# Altium footprint library motionboard.PcbLib: 89 footprints (part 1 of 6)
Each footprint in its own frame and in the unit in brackets; x right, y up, seen from the top. Pads: shape width x height; smd on the part's side, far side on the other; paste and mask are expansions set on the pad; w line width, h text height; cw(c..) or ccw(c..) is an arc to the next point about the centre after c.
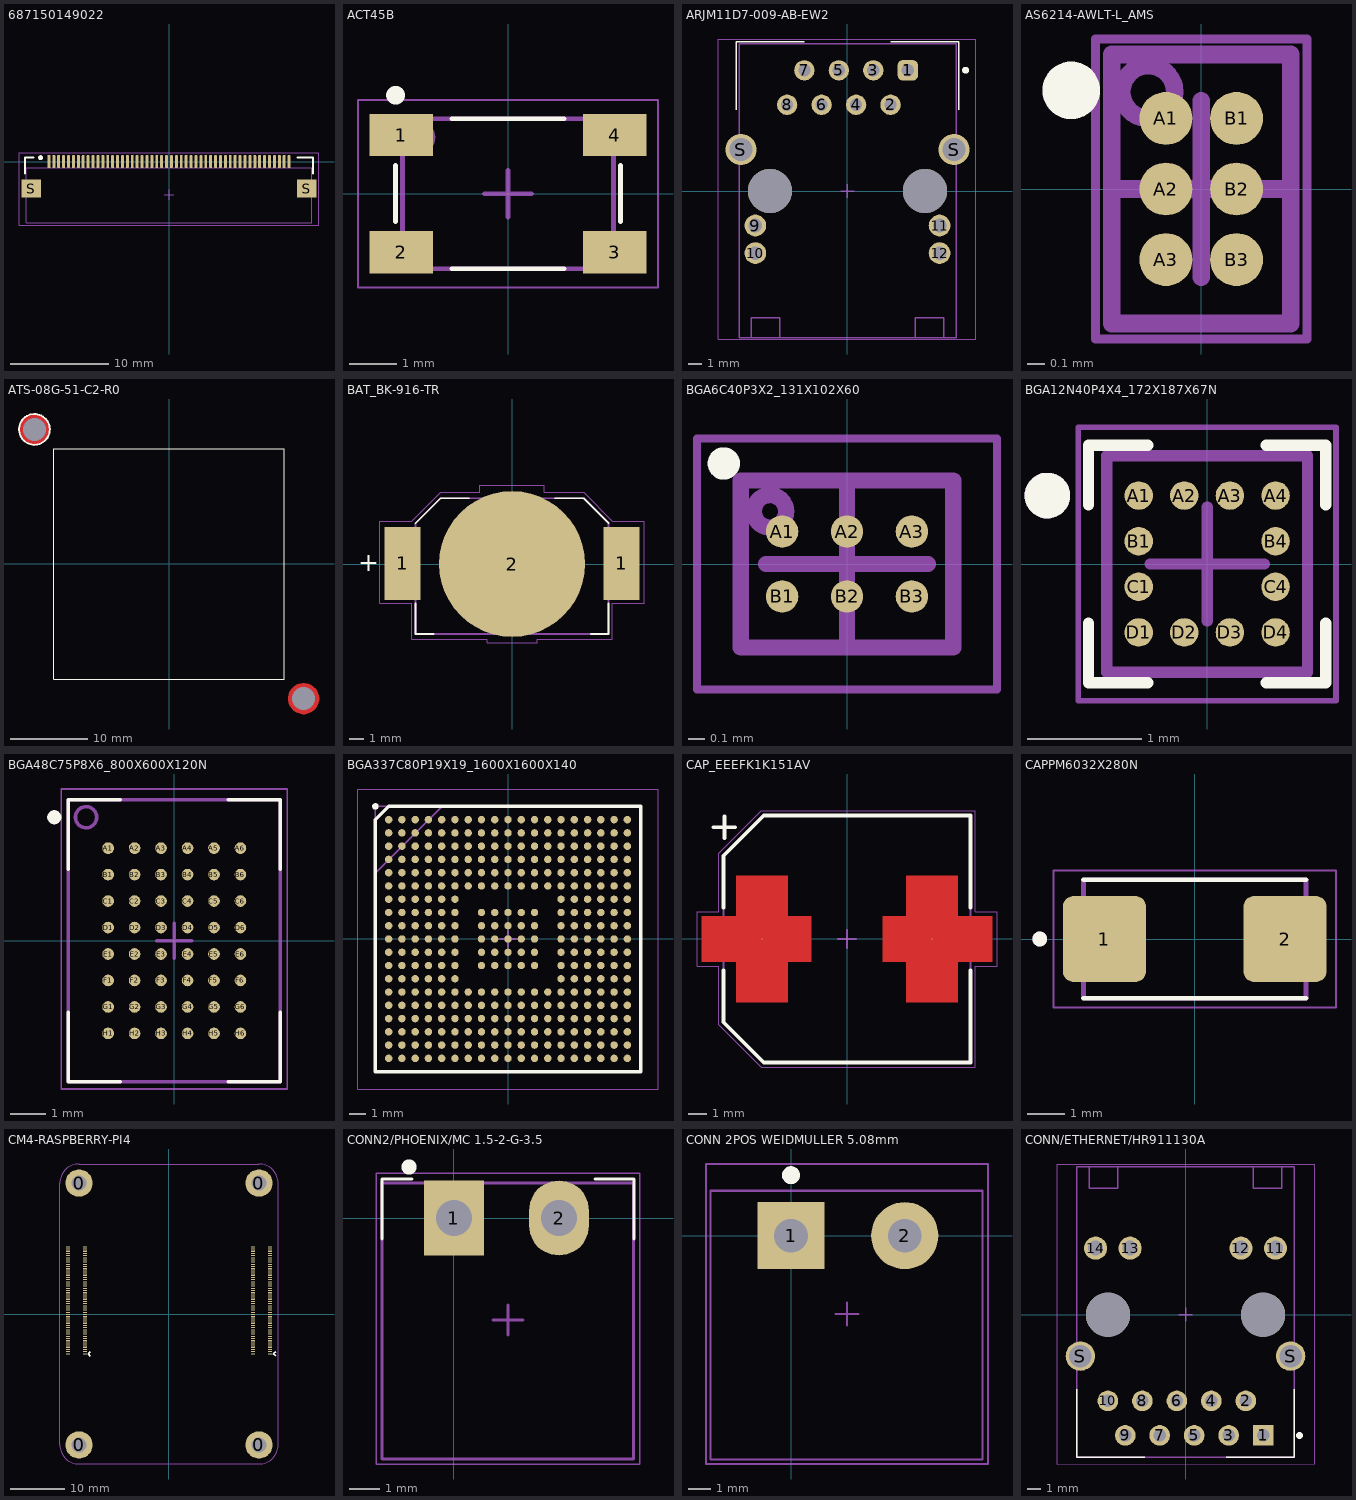
[diagram p0: the footprints below, top view; thin cyan lines are the x and y axes]

## 687150149022 [mm]
pads (52):
  rect 0.3x1.3 smd: 1(-12.25,0)
  rrect50% 0.3x1.3 smd: 2(-11.75,0) 3(-11.25,0) 4(-10.75,0) 5(-10.25,0) 6(-9.75,0) 7(-9.25,0) 8(-8.75,0) 9(-8.25,0) 10(-7.75,0) 11(-7.25,0) 12(-6.75,0) 13(-6.25,0) 14(-5.75,0) 15(-5.25,0) 16(-4.75,0) 17(-4.25,0) 18(-3.75,0) 19(-3.25,0) 20(-2.75,0) 21(-2.25,0) 22(-1.75,0) 23(-1.25,0) 24(-0.75,0) 25(-0.25,0) 26(0.25,0) 27(0.75,0) 28(1.25,0) 29(1.75,0) 30(2.25,0) 31(2.75,0) 32(3.25,0) 33(3.75,0) 34(4.25,0) 35(4.75,0) 36(5.25,0) 37(5.75,0) 38(6.25,0) 39(6.75,0) 40(7.25,0) 41(7.75,0) 42(8.25,0) 43(8.75,0) 44(9.25,0) 45(9.75,0) 46(10.25,0) 47(10.75,0) 48(11.25,0) 49(11.75,0) 50(12.25,0)
  rect 2x1.8 smd: S(-14.05,-2.75) S(14.05,-2.75)
Top Overlay:
  circle w0.3: c-13.1,0.4 r0.1
  lines w0.2: -14.7,-1.2 -14.7,0.4 -13.8,0.4 ; 13.1,0.4 14.7,0.4 14.7,-1.2
Top Assembly:
  lines w0.1: -14.55,-6.25 -14.55,-0.65 14.55,-0.65 14.55,-6.25 -14.55,-6.25
Top Courtyard:
  lines w0.05: -15.3,-6.5 -15.3,0.9 15.3,0.9 15.3,-6.5 -15.3,-6.5
  lines w0.1: -0.5,-3.4 0.5,-3.4 ; 0,-3.9 0,-2.9
Top Designator:
  text ".Designator" at -2.705,-3.072 h1.2
3D body "687150149022.stp": height 2.22, standoff -0.03, extent -14.55,-6.217 14.55,0.283

## ACT45B [mm] "COMMON MODE CHOKE"
pads (4):
  rect 1.35x0.9 smd: 1(-2.275,1.25) 2(-2.275,-1.25) 3(2.275,-1.25) 4(2.275,1.25)
Top Overlay:
  circle w0.2: c-2.4,2.1 r0.1
  lines w0.1: -2.4,-0.6 -2.4,0.6 ; -1.2,-1.6 1.2,-1.6 ; -1.2,1.6 1.2,1.6 ; 2.4,-0.6 2.4,0.6
Top Assembly:
  circle w0.1: c-1.9,1.2 r0.3
  lines w0.1: -2.25,-1.6 2.25,-1.6 2.25,1.6 -2.25,1.6 -2.25,-1.6
Top Courtyard:
  lines w0.05: -3.2,-2 3.2,-2 3.2,2 -3.2,2 -3.2,-2
  lines w0.1: -0.5,0 0.5,0 ; 0,-0.5 0,0.5
Top Designator:
  text ".Designator" at -2.705,-0.134 h1.2
3D body "act45b.STEP": height 3, standoff 0, extent -2.25,-1.6 2.25,1.6

## ARJM11D7-009-AB-EW2 [mm] "ARJM11D7-009-AB-EW2 Manufacturer Guidelines"
height 13.45
pads (16):
  rrect50% 1.5x1.5 hole 0.9: 1(4.445,8.89)
  round 1.5 hole 0.9: 2(3.175,6.35) 3(1.905,8.89) 4(0.635,6.35) 5(-0.635,8.89) 6(-1.905,6.35) 7(-3.175,8.89) 8(-4.445,6.35)
  round 1.6 hole 1: 9(-6.785,-2.54) 10(-6.785,-4.57) 11(6.785,-2.54) 12(6.785,-4.57)
  round 2.3 hole 1.7: S(-7.85,3.05) S(7.85,3.05)
  round 3.25 hole 3.25 unplated: ""(-5.715,0) ""(5.715,0)
Top Overlay:
  circle w0.3: c8.7,8.9 r0.1
  lines w0.1: -8.2,6.001 -8.2,11 -3.201,11 ; 3.201,11.002 8.2,11.002 8.2,6.003
Top Assembly:
  lines w0.1: -7.1,-10.8 -7.1,-9.35 -5,-9.35 -5,-10.8 ; 5.005,-10.795 5.005,-9.345 7.105,-9.345 7.105,-10.795 ; -7.985,-10.8 -7.985,10.855 8,10.855 8,-10.8 -7.985,-10.8
Top Courtyard:
  lines w0.05: -9.535,-10.9 9.465,-10.9 9.465,11.2 -9.535,11.2 -9.535,-10.9
  lines w0.1: -0.5,0 0.5,0 ; 0,-0.5 0,0.5
Top Designator:
  text ".Designator" at -2.74,-0.122 h1.2
3D body "ARJM11D7-009-AB-EW2.STEP": height 13.8, standoff -3.6, extent -7.99,-10.795 7.99,10.855

## AS6214-AWLT-L_AMS [mm]
pads (6):
  round 0.3 smd paste+0: A1(-0.2,0.4) A2(-0.2,0) A3(-0.2,-0.4) B1(0.2,0.4) B2(0.2,0) B3(0.2,-0.4)
Top Overlay:
  circle w0.254: c-0.737,0.559 r0.036
Top Assembly:
  circle w0.1: c-0.3,0.55 r0.15
  lines w0.1: -0.508,-0.762 -0.508,0.762 0.508,0.762 0.508,-0.762 -0.508,-0.762
Top Courtyard:
  lines w0.05: -0.6,-0.85 -0.6,0.85 0.6,0.85 0.6,-0.85 -0.6,-0.85
  lines w0.1: -0.5,0 0.5,0 ; 0,-0.5 0,0.5
Top Designator:
  text ".Designator" at -2.842,-0.272 h1.2
3D body "WLCSP-6.STEP": height 0.22, standoff -0.38, extent -0.523,-0.757 0.523,0.757

## ATS-08G-51-C2-R0 [mm]
pads (2):
  round 0 hole 3: 1(-17.5,17.5) 1(17.5,-17.5)
Top Layer:
  pour cut-out: -15.519,17.501 -15.519,17.698 -15.597,18.086 -15.748,18.451 -15.967,18.78 -16.247,19.059 -16.576,19.279 -16.941,19.43 -17.328,19.507 -17.526,19.507 -17.724,19.507 -18.111,19.43 -18.476,19.279 -18.805,19.059 -19.085,18.78 -19.304,18.451 -19.455,18.086 -19.533,17.698 -19.533,17.501 -19.533,17.303 -19.455,16.915 -19.304,16.55 -19.085,16.221 -18.805,15.942 -18.476,15.722 -18.111,15.571 -17.724,15.494 -17.526,15.494 -17.501,15.494 -17.305,15.494 -16.923,15.57 -16.562,15.719 -16.238,15.936 -15.962,16.212 -15.745,16.537 -15.596,16.897 -15.519,17.28 -15.519,17.475
  pour cut-out: 19.507,-17.526 19.507,-17.328 19.43,-16.941 19.279,-16.576 19.059,-16.247 18.78,-15.967 18.451,-15.748 18.086,-15.597 17.698,-15.519 17.501,-15.519 17.303,-15.519 16.915,-15.597 16.55,-15.748 16.221,-15.967 15.942,-16.247 15.722,-16.576 15.571,-16.941 15.494,-17.328 15.494,-17.526 15.494,-17.724 15.571,-18.111 15.722,-18.476 15.942,-18.805 16.221,-19.085 16.55,-19.304 16.915,-19.455 17.303,-19.533 17.501,-19.533 17.526,-19.533 17.721,-19.533 18.104,-19.456 18.464,-19.307 18.789,-19.09 19.065,-18.814 19.282,-18.49 19.431,-18.129 19.507,-17.747 19.507,-17.551
Top Overlay:
  circle w0.254: c-17.526,17.501 r2
  lines w0.152: -15,-15 15,-15 15,15 -15,15 -15,-15
Top Designator:
  text ".Designator" at -2.667,-0.297 h1.2
3D body "ATS-PP-02.STEP": height 11.27, standoff -1.52, extent 14.026,-20.963 21.026,-13.987
3D body "ATS-PP-02.STEP": height 11.27, standoff -1.52, extent -20.95,13.936 -13.95,20.912
3D body "ATS-08G-51-C2-R0.STEP": height 22, standoff 2, extent -19.842,-19.897 19.839,19.791

## BAT_BK-916-TR [mm]
pads (3):
  rect 2.5x5.1 smd: 1(-7.65,0.05) 1(7.65,0.05)
  round 10.2 smd mask+0.508: 2(0,0)
Top Overlay:
  lines w0.127: -6.75,-2.75 -6.75,-4.9 -5.5,-4.9 ; -6.75,2.85 -5,4.6 -3,4.6 ; 3,4.6 5,4.6 6.75,2.85 ; 5.5,-4.9 6.75,-4.9 6.75,-2.75
  text "+" at -10.767,-0.501 h1.27
Top 3D Body:
  lines w0.127: -6.75,-4.9 -6.75,2.85 -5,4.6 5,4.6 6.75,2.85 6.75,-4.9 -6.75,-4.9
Top Courtyard:
  lines w0.05: -9.25,-2.75 -7,-2.75 -7,-5.25 -1.75,-5.25 -1.75,-5.5 1.75,-5.5 1.75,-5.25 7,-5.25 7,-2.75 9.25,-2.75 9.25,3 7,3 5,5 2.25,5 2.25,5.5 -2.25,5.5 -2.25,5 -5,5 -7,3 -9.25,3 -9.25,-2.75
Top Designator:
  text ".Designator" at -3.578,-0.013 h1.2
3D body "User Library-CR1216.STEP": height 1.6, standoff 0, extent -6.271,-5.938 6.124,6.456
3D body "BK-916.STEP": height 3.7, standoff 0, extent -7.798,-4.952 7.802,4.648

## BGA6C40P3X2_131X102X60 [mm] "BGA, 6-Leads, Body 1.31x1.02mmx0.60mm, Pitch 0.40mm"
height 0.6
pads (6):
  round 0.2 smd: A1(-0.4,0.2) A2(0,0.2) A3(0.4,0.2) B1(-0.4,-0.2) B2(0,-0.2) B3(0.4,-0.2)
Top Overlay:
  circle w0.1: c-0.76,0.62 r0.05
Top Assembly:
  circle w0.1: c-0.475,0.325 r0.1
  lines w0.1: -0.655,-0.515 -0.655,0.515 0.655,0.515 0.655,-0.515 -0.655,-0.515
Top Courtyard:
  lines w0.05: -0.925,-0.775 -0.925,0.775 0.925,0.775 0.925,-0.775 -0.925,-0.775
  lines w0.1: -0.5,0 0.5,0 ; 0,-0.5 0,0.5
Top Designator:
  text ".Designator" at -2.705,-0.272 h1.2
3D body "BGA6C40P3X2_131X102X60.step": height 0.6, standoff 0, extent -0.655,-0.515 0.655,0.515

## BGA12N40P4X4_172X187X67N [mm]
pads (12):
  round 0.25 smd: A1(-0.6,0.6) A2(-0.2,0.6) A3(0.2,0.6) A4(0.6,0.6) B1(-0.6,0.2) B4(0.6,0.2) C1(-0.6,-0.2) C4(0.6,-0.2) D1(-0.6,-0.6) D2(-0.2,-0.6) D3(0.2,-0.6) D4(0.6,-0.6)
Top Overlay:
  circle w0.2: c-1.4,0.6 r0.1
  lines w0.1: -1.04,-0.52 -1.04,-1.04 -0.52,-1.04 ; -1.04,0.52 -1.04,1.04 -0.52,1.04 ; 0.52,-1.04 1.04,-1.04 1.04,-0.52 ; 0.52,1.04 1.04,1.04 1.04,0.52
Top Assembly:
  circle w0.2: c-1.4,0.6 r0.1
  lines w0.1: -0.88,-0.95 0.88,-0.95 0.88,0.95 -0.88,0.95 -0.88,-0.95
Top Courtyard:
  lines w0.05: -1.13,-1.2 -1.13,1.2 1.13,1.2 1.13,-1.2 -1.13,-1.2
  lines w0.1: -0.5,0 0.5,0 ; 0,-0.5 0,0.5
Top Designator:
  text ".Designator" at -2.927,-0.272 h1.2
3D body "step_temp.STEP": height 0.67, standoff 0.01, extent -0.863,-0.937 0.863,0.937

## BGA48C75P8X6_800X600X120N [mm]
pads (48):
  round 0.33 smd: A1(-1.875,2.625) A2(-1.125,2.625) A3(-0.375,2.625) A4(0.375,2.625) A5(1.125,2.625) A6(1.875,2.625) B1(-1.875,1.875) B2(-1.125,1.875) B3(-0.375,1.875) B4(0.375,1.875) B5(1.125,1.875) B6(1.875,1.875) C1(-1.875,1.125) C2(-1.125,1.125) C3(-0.375,1.125) C4(0.375,1.125) C5(1.125,1.125) C6(1.875,1.125) D1(-1.875,0.375) D2(-1.125,0.375) D3(-0.375,0.375) D4(0.375,0.375) D5(1.125,0.375) D6(1.875,0.375) E1(-1.875,-0.375) E2(-1.125,-0.375) E3(-0.375,-0.375) E4(0.375,-0.375) E5(1.125,-0.375) E6(1.875,-0.375) F1(-1.875,-1.125) F2(-1.125,-1.125) F3(-0.375,-1.125) F4(0.375,-1.125) F5(1.125,-1.125) F6(1.875,-1.125) G1(-1.875,-1.875) G2(-1.125,-1.875) G3(-0.375,-1.875) G4(0.375,-1.875) G5(1.125,-1.875) G6(1.875,-1.875) H1(-1.875,-2.625) H2(-1.125,-2.625) H3(-0.375,-2.625) H4(0.375,-2.625) H5(1.125,-2.625) H6(1.875,-2.625)
Top Overlay:
  circle w0.2: c-3.4,3.5 r0.1
  lines w0.1: -3,-2.025 -3,-4 -1.525,-4 ; -3,2.025 -3,4 -1.525,4 ; 1.525,-4 3,-4 3,-2.025 ; 1.525,4 3,4 3,2.025
Top Assembly:
  circle w0.1: c-2.5,3.5 r0.3
  lines w0.1: -3,-4 -3,4 3,4 3,-4 -3,-4
Top Courtyard:
  lines w0.05: -3.2,-4.2 -3.2,4.3 3.2,4.3 3.2,-4.2 -3.2,-4.2
  lines w0.1: -0.5,0 0.5,0 ; 0,-0.5 0,0.5
Top Designator:
  text ".Designator" at -2.892,-0.222 h1.2
3D body "IS61WV25616EDBLL-8BLI.STEP": height 1.2, standoff 0, extent -3,-4 3,4

## BGA337C80P19X19_1600X1600X140 [mm]
pads (337):
  round 0.45 smd: A1(-7.2,7.2) A2(-6.4,7.2) A3(-5.6,7.2) A4(-4.8,7.2) A5(-4,7.2) A6(-3.2,7.2) A7(-2.4,7.2) A8(-1.6,7.2) A9(-0.8,7.2) A10(0,7.2) A11(0.8,7.2) A12(1.6,7.2) A13(2.4,7.2) A14(3.2,7.2) A15(4,7.2) A16(4.8,7.2) A17(5.6,7.2) A18(6.4,7.2) A19(7.2,7.2) B1(-7.2,6.4) B2(-6.4,6.4) B3(-5.6,6.4) B4(-4.8,6.4) B5(-4,6.4) B6(-3.2,6.4) B7(-2.4,6.4) B8(-1.6,6.4) B9(-0.8,6.4) B10(0,6.4) B11(0.8,6.4) B12(1.6,6.4) B13(2.4,6.4) B14(3.2,6.4) B15(4,6.4) B16(4.8,6.4) B17(5.6,6.4) B18(6.4,6.4) B19(7.2,6.4) C1(-7.2,5.6) C2(-6.4,5.6) C3(-5.6,5.6) C4(-4.8,5.6) C5(-4,5.6) C6(-3.2,5.6) C7(-2.4,5.6) C8(-1.6,5.6) C9(-0.8,5.6) C10(0,5.6) C11(0.8,5.6) C12(1.6,5.6) C13(2.4,5.6) C14(3.2,5.6) C15(4,5.6) C16(4.8,5.6) C17(5.6,5.6) C18(6.4,5.6) C19(7.2,5.6) D1(-7.2,4.8) D2(-6.4,4.8) D3(-5.6,4.8) D4(-4.8,4.8) D5(-4,4.8) D6(-3.2,4.8) D7(-2.4,4.8) D8(-1.6,4.8) D9(-0.8,4.8) D10(0,4.8) D11(0.8,4.8) D12(1.6,4.8) D13(2.4,4.8) D14(3.2,4.8) D15(4,4.8) D16(4.8,4.8) D17(5.6,4.8) D18(6.4,4.8) D19(7.2,4.8) E1(-7.2,4) E2(-6.4,4) E3(-5.6,4) E4(-4.8,4) E5(-4,4) E6(-3.2,4) E7(-2.4,4) E8(-1.6,4) E9(-0.8,4) E10(0,4) E11(0.8,4) E12(1.6,4) E13(2.4,4) E14(3.2,4) E15(4,4) E16(4.8,4) E17(5.6,4) E18(6.4,4) E19(7.2,4) F1(-7.2,3.2) F2(-6.4,3.2) F3(-5.6,3.2) F4(-4.8,3.2) F5(-4,3.2) F6(-3.2,3.2) F7(-2.4,3.2) F8(-1.6,3.2) F9(-0.8,3.2) F10(0,3.2) F11(0.8,3.2) F12(1.6,3.2) F13(2.4,3.2) F14(3.2,3.2) F15(4,3.2) F16(4.8,3.2) F17(5.6,3.2) F18(6.4,3.2) F19(7.2,3.2) G1(-7.2,2.4) G2(-6.4,2.4) G3(-5.6,2.4) G4(-4.8,2.4) G5(-4,2.4) G6(-3.2,2.4) G14(3.2,2.4) G15(4,2.4) G16(4.8,2.4) G17(5.6,2.4) G18(6.4,2.4) G19(7.2,2.4) H1(-7.2,1.6) H2(-6.4,1.6) H3(-5.6,1.6) H4(-4.8,1.6) H5(-4,1.6) H6(-3.2,1.6) H8(-1.6,1.6) H9(-0.8,1.6) H10(0,1.6) H11(0.8,1.6) H12(1.6,1.6) H14(3.2,1.6) H15(4,1.6) H16(4.8,1.6) H17(5.6,1.6) H18(6.4,1.6) H19(7.2,1.6) J1(-7.2,0.8) J2(-6.4,0.8) J3(-5.6,0.8) J4(-4.8,0.8) J5(-4,0.8) J6(-3.2,0.8) J8(-1.6,0.8) J9(-0.8,0.8) J10(0,0.8) J11(0.8,0.8) J12(1.6,0.8) J14(3.2,0.8) J15(4,0.8) J16(4.8,0.8) J17(5.6,0.8) J18(6.4,0.8) J19(7.2,0.8) K1(-7.2,0) K2(-6.4,0) K3(-5.6,0) K4(-4.8,0) K5(-4,0) K6(-3.2,0) K8(-1.6,0) K9(-0.8,0) K10(0,0) K11(0.8,0) K12(1.6,0) K14(3.2,0) K15(4,0) K16(4.8,0) K17(5.6,0) K18(6.4,0) K19(7.2,0) L1(-7.2,-0.8) L2(-6.4,-0.8) L3(-5.6,-0.8) L4(-4.8,-0.8) L5(-4,-0.8) L6(-3.2,-0.8) L8(-1.6,-0.8) L9(-0.8,-0.8) L10(0,-0.8) L11(0.8,-0.8) L12(1.6,-0.8) L14(3.2,-0.8) L15(4,-0.8) L16(4.8,-0.8) L17(5.6,-0.8) L18(6.4,-0.8) L19(7.2,-0.8) M1(-7.2,-1.6) M2(-6.4,-1.6) M3(-5.6,-1.6) M4(-4.8,-1.6) M5(-4,-1.6) M6(-3.2,-1.6) M8(-1.6,-1.6) M9(-0.8,-1.6) M10(0,-1.6) M11(0.8,-1.6) M12(1.6,-1.6) M14(3.2,-1.6) M15(4,-1.6) M16(4.8,-1.6) M17(5.6,-1.6) M18(6.4,-1.6) M19(7.2,-1.6) N1(-7.2,-2.4) N2(-6.4,-2.4) N3(-5.6,-2.4) N4(-4.8,-2.4) N5(-4,-2.4) N6(-3.2,-2.4) N14(3.2,-2.4) N15(4,-2.4) N16(4.8,-2.4) N17(5.6,-2.4) N18(6.4,-2.4) N19(7.2,-2.4) P1(-7.2,-3.2) P2(-6.4,-3.2) P3(-5.6,-3.2) P4(-4.8,-3.2) P5(-4,-3.2) P6(-3.2,-3.2) P7(-2.4,-3.2) P8(-1.6,-3.2) P9(-0.8,-3.2) P10(0,-3.2) P11(0.8,-3.2) P12(1.6,-3.2) P13(2.4,-3.2) P14(3.2,-3.2) P15(4,-3.2) P16(4.8,-3.2) P17(5.6,-3.2) P18(6.4,-3.2) P19(7.2,-3.2) R1(-7.2,-4) R2(-6.4,-4) R3(-5.6,-4) R4(-4.8,-4) R5(-4,-4) R6(-3.2,-4) R7(-2.4,-4) R8(-1.6,-4) R9(-0.8,-4) R10(0,-4) R11(0.8,-4) R12(1.6,-4) R13(2.4,-4) R14(3.2,-4) R15(4,-4) R16(4.8,-4) R17(5.6,-4) R18(6.4,-4) R19(7.2,-4) T1(-7.2,-4.8) T2(-6.4,-4.8) T3(-5.6,-4.8) T4(-4.8,-4.8) T5(-4,-4.8) T6(-3.2,-4.8) T7(-2.4,-4.8) T8(-1.6,-4.8) T9(-0.8,-4.8) T10(0,-4.8) T11(0.8,-4.8) T12(1.6,-4.8) T13(2.4,-4.8) T14(3.2,-4.8) T15(4,-4.8) T16(4.8,-4.8) T17(5.6,-4.8) T18(6.4,-4.8) T19(7.2,-4.8) U1(-7.2,-5.6) U2(-6.4,-5.6) U3(-5.6,-5.6) U4(-4.8,-5.6) U5(-4,-5.6) U6(-3.2,-5.6) U7(-2.4,-5.6) U8(-1.6,-5.6) U9(-0.8,-5.6) U10(0,-5.6) U11(0.8,-5.6) U12(1.6,-5.6) U13(2.4,-5.6) U14(3.2,-5.6) U15(4,-5.6) U16(4.8,-5.6) U17(5.6,-5.6) U18(6.4,-5.6) U19(7.2,-5.6) V1(-7.2,-6.4) V2(-6.4,-6.4) V3(-5.6,-6.4) V4(-4.8,-6.4) V5(-4,-6.4) V6(-3.2,-6.4) V7(-2.4,-6.4) V8(-1.6,-6.4) V9(-0.8,-6.4) V10(0,-6.4) V11(0.8,-6.4) V12(1.6,-6.4) V13(2.4,-6.4) V14(3.2,-6.4) V15(4,-6.4) V16(4.8,-6.4) V17(5.6,-6.4) V18(6.4,-6.4) V19(7.2,-6.4) W1(-7.2,-7.2) W2(-6.4,-7.2) W3(-5.6,-7.2) W4(-4.8,-7.2) W5(-4,-7.2) W6(-3.2,-7.2) W7(-2.4,-7.2) W8(-1.6,-7.2) W9(-0.8,-7.2) W10(0,-7.2) W11(0.8,-7.2) W12(1.6,-7.2) W13(2.4,-7.2) W14(3.2,-7.2) W15(4,-7.2) W16(4.8,-7.2) W17(5.6,-7.2) W18(6.4,-7.2) W19(7.2,-7.2)
Top Overlay:
  circle w0.2: c-8,8 r0.1
  lines w0.2: -8,-8 8,-8 8,8 -7.2,8 -8,7.2 -8,-8
Top Assembly:
  lines w0.1: -8,3.975 -3.975,8 ; -8,-8 8,-8 8,8 -8,8 -8,-8
Top Courtyard:
  lines w0.05: -9.05,-9.05 9.05,-9.05 9.05,9.05 -9.05,9.05 -9.05,-9.05
  lines w0.1: -0.5,0 0.5,0 ; 0,-0.5 0,0.5
Top Designator:
  text ".Designator" at -2.705,-0.272 h1.2
3D body "F28388DZWTS.stp": height 1.34, standoff 0, extent -8,-8 8,8

## CAP_EEEFK1K151AV [mil]
pads (2):
  round 1 smd: 1(-183.07,0) 2(183.07,0)
Top Layer:
  region: -312.99,-49.21 -238.19,-49.21 -238.19,-135.83 -127.95,-135.83 -127.95,-49.21 -76.77,-49.21 -76.77,49.21 -127.95,49.21 -127.95,135.83 -238.19,135.83 -238.19,49.21 -312.99,49.21
  region: 238.19,49.21 312.99,49.21 312.99,-49.21 238.19,-49.21 238.19,-135.83 127.95,-135.83 127.95,-49.21 76.77,-49.21 76.77,49.21 127.95,49.21 127.95,135.83 238.19,135.83
Top Overlay:
  lines w7.87: -287.4,240.16 -240.16,240.16 ; -265.75,-66.93 -265.75,-179.13 -179.13,-265.75 265.75,-265.75 265.75,-66.93 ; -265.75,66.93 -265.75,179.13 -179.13,265.75 265.75,265.75 265.75,66.93 ; -263.78,216.54 -263.78,263.78
Top Assembly:
  lines w3.94: -287.4,240.16 -240.16,240.16 ; -263.78,216.54 -263.78,263.78 ; -265.75,-179.13 -265.75,179.13 -179.13,265.75 265.75,265.75 265.75,-265.75 -179.13,-265.75 -265.75,-179.13
Top Courtyard:
  lines w1.97: -322.83,-59.05 -275.59,-59.05 -275.59,-184.05 -184.05,-275.59 275.59,-275.59 275.59,-59.05 322.83,-59.05 322.83,59.06 275.59,59.06 275.59,275.59 -184.05,275.59 -275.59,184.06 -275.59,59.06 -322.83,59.06 -322.83,-59.05
  lines w3.94: -19.68,0 19.68,0 ; 0,-19.68 0,19.68
Top Designator:
  text ".Designator" at -106.49,-10.69 h47.24
3D body "step_temp.STEP": height 543.35, standoff 0, extent -293.31,-265.75 293.31,265.75

## CAPPM6032X280N [mm]
pads (2):
  rrect25% 2.24x2.32 smd: 1(-2.435,0) 2(2.435,0)
Top Overlay:
  circle w0.2: c-4.18,0 r0.1
  lines w0.127: -3,-1.6 3,-1.6 ; -3,1.6 3,1.6
Top 3D Body:
  circle w0.2: c-4.18,0 r0.1
  lines w0.127: -3,-1.6 3,-1.6 3,1.6 -3,1.6 -3,-1.6
Top Courtyard:
  lines w0.05: -3.81,-1.85 3.81,-1.85 3.81,1.85 -3.805,1.85 -3.81,-1.85
Top Designator:
  text ".Designator" at -2.977,-0.272 h1.2
3D body "AVX_C_CASE.STEP": height 2.7, standoff 0, extent -3.05,-1.675 3.05,1.675

## CM4-RASPBERRY-PI4 [mm] "DF40C-100DS-0.4v by Amornthep Phunsin"
pads (204):
  round 5 hole 2.7: 0(-16.5,-24) 0(-16.5,24) 0(16.5,-24) 0(16.5,24)
  rect 0.7x0.2 smd: 1(18.5,-7.3) 2(15.42,-7.3) 3(18.5,-6.9) 4(15.42,-6.9) 5(18.5,-6.5) 6(15.42,-6.5) 7(18.5,-6.1) 8(15.42,-6.1) 9(18.5,-5.7) 10(15.42,-5.7) 11(18.5,-5.3) 12(15.42,-5.3) 13(18.5,-4.9) 14(15.42,-4.9) 15(18.5,-4.5) 16(15.42,-4.5) 17(18.5,-4.1) 18(15.42,-4.1) 19(18.5,-3.7) 20(15.42,-3.7) 21(18.5,-3.3) 22(15.42,-3.3) 23(18.5,-2.9) 24(15.42,-2.9) 25(18.5,-2.5) 26(15.42,-2.5) 27(18.5,-2.1) 28(15.42,-2.1) 29(18.5,-1.7) 30(15.42,-1.7) 31(18.5,-1.3) 32(15.42,-1.3) 33(18.5,-0.9) 34(15.42,-0.9) 35(18.5,-0.5) 36(15.42,-0.5) 37(18.5,-0.1) 38(15.42,-0.1) 39(18.5,0.3) 40(15.42,0.3) 41(18.5,0.7) 42(15.42,0.7) 43(18.5,1.1) 44(15.42,1.1) 45(18.5,1.5) 46(15.42,1.5) 47(18.5,1.9) 48(15.42,1.9) 49(18.5,2.3) 50(15.42,2.3) 51(18.5,2.7) 52(15.42,2.7) 53(18.5,3.1) 54(15.42,3.1) 55(18.5,3.5) 56(15.42,3.5) 57(18.5,3.9) 58(15.42,3.9) 59(18.5,4.3) 60(15.42,4.3) 61(18.5,4.7) 62(15.42,4.7) 63(18.5,5.1) 64(15.42,5.1) 65(18.5,5.5) 66(15.42,5.5) 67(18.5,5.9) 68(15.42,5.9) 69(18.5,6.3) 70(15.42,6.3) 71(18.5,6.7) 72(15.42,6.7) 73(18.5,7.1) 74(15.42,7.1) 75(18.5,7.5) 76(15.42,7.5) 77(18.5,7.9) 78(15.42,7.9) 79(18.5,8.3) 80(15.42,8.3) 81(18.5,8.7) 82(15.42,8.7) 83(18.5,9.1) 84(15.42,9.1) 85(18.5,9.5) 86(15.42,9.5) 87(18.5,9.9) 88(15.42,9.9) 89(18.5,10.3) 90(15.42,10.3) 91(18.5,10.7) 92(15.42,10.7) 93(18.5,11.1) 94(15.42,11.1) 95(18.5,11.5) 96(15.42,11.5) 97(18.5,11.9) 98(15.42,11.9) 99(18.5,12.3) 100(15.42,12.3) 101(-15.42,-7.3) 102(-18.5,-7.3) 103(-15.42,-6.9) 104(-18.5,-6.9) 105(-15.42,-6.5) 106(-18.5,-6.5) 107(-15.42,-6.1) 108(-18.5,-6.1) 109(-15.42,-5.7) 110(-18.5,-5.7) 111(-15.42,-5.3) 112(-18.5,-5.3) 113(-15.42,-4.9) 114(-18.5,-4.9) 115(-15.42,-4.5) 116(-18.5,-4.5) 117(-15.42,-4.1) 118(-18.5,-4.1) 119(-15.42,-3.7) 120(-18.5,-3.7) 121(-15.42,-3.3) 122(-18.5,-3.3) 123(-15.42,-2.9) 124(-18.5,-2.9) 125(-15.42,-2.5) 126(-18.5,-2.5) 127(-15.42,-2.1) 128(-18.5,-2.1) 129(-15.42,-1.7) 130(-18.5,-1.7) 131(-15.42,-1.3) 132(-18.5,-1.3) 133(-15.42,-0.9) 134(-18.5,-0.9) 135(-15.42,-0.5) 136(-18.5,-0.5) 137(-15.42,-0.1) 138(-18.5,-0.1) 139(-15.42,0.3) 140(-18.5,0.3) 141(-15.42,0.7) 142(-18.5,0.7) 143(-15.42,1.1) 144(-18.5,1.1) 145(-15.42,1.5) 146(-18.5,1.5) 147(-15.42,1.9) 148(-18.5,1.9) 149(-15.42,2.3) 150(-18.5,2.3) 151(-15.42,2.7) 152(-18.5,2.7) 153(-15.42,3.1) 154(-18.5,3.1) 155(-15.42,3.5) 156(-18.5,3.5) 157(-15.42,3.9) 158(-18.5,3.9) 159(-15.42,4.3) 160(-18.5,4.3) 161(-15.42,4.7) 162(-18.5,4.7) 163(-15.42,5.1) 164(-18.5,5.1) 165(-15.42,5.5) 166(-18.5,5.5) 167(-15.42,5.9) 168(-18.5,5.9) 169(-15.42,6.3) 170(-18.5,6.3) 171(-15.42,6.7) 172(-18.5,6.7) 173(-15.42,7.1) 174(-18.5,7.1) 175(-15.42,7.5) 176(-18.5,7.5) 177(-15.42,7.9) 178(-18.5,7.9) 179(-15.42,8.3) 180(-18.5,8.3) 181(-15.42,8.7) 182(-18.5,8.7) 183(-15.42,9.1) 184(-18.5,9.1) 185(-15.42,9.5) 186(-18.5,9.5) 187(-15.42,9.9) 188(-18.5,9.9) 189(-15.42,10.3) 190(-18.5,10.3) 191(-15.42,10.7) 192(-18.5,10.7) 193(-15.42,11.1) 194(-18.5,11.1) 195(-15.42,11.5) 196(-18.5,11.5) 197(-15.42,11.9) 198(-18.5,11.9) 199(-15.42,12.3) 200(-18.5,12.3)
Top Overlay:
  lines w0.254: -14.415,-7.704 -14.815,-7.304 ; -14.415,-6.904 -14.815,-7.304 ; 19.538,-7.688 19.138,-7.288 ; 19.538,-6.888 19.138,-7.288 ; -14.815,-7.304 -14.815,-7.304 ; 19.138,-7.288 19.138,-7.288
Top Courtyard:
  lines w0.12: -20,-24 ccw(c-16.5,-24) -16.5,-27.5 16.5,-27.5 ccw(c16.5,-24) 20,-24 20,24 ccw(c16.5,24) 16.5,27.5 -16.5,27.5 ccw(c-16.5,24) -20,24 -20,-24
Top Designator:
  text ".Designator" at -2.705,-0.272 h1.2
3D body "cm4-rev1-3_new.STEP": height 5.15, standoff 0.37, extent -20,-27.5 20,27.5
3D body "DF40C-100DS.stp": height 1.4, standoff -0.05, extent -18.69,-8.785 -15.31,13.815
3D body "DF40C-100DS.stp": height 1.4, standoff -0.05, extent 15.31,-8.785 18.69,13.815

## CONN2/PHOENIX/MC 1.5-2-G-3.5 [mm]
pads (2):
  rect 2x2.5 hole 1.2: 1(0,0)
  oval 2x2.5 hole 1.2: 2(3.5,0)
Top Overlay:
  circle w0.3: c-1.5,1.7 r0.1
  lines w0.1: -2.4,-0.7 -2.4,1.3 -1.4,1.3 ; 4.7,1.3 6,1.3 6,-0.7
Top Assembly:
  lines w0.1: -2.4,-8.029 -2.4,1.171 5.987,1.171 5.987,-8.029 -2.4,-8.029
Top Courtyard:
  lines w0.05: -2.6,-8.2 -2.6,1.5 6.2,1.5 6.2,-8.2 -2.6,-8.2
  lines w0.1: 1.3,-3.4 2.3,-3.4 ; 1.8,-3.9 1.8,-2.9
Top Designator:
  text ".Designator" at -0.905,-3.409 h1.2
3D body "pxc_1844210_05_MC-1-5-2-G-3-5_3D.stp": height 7.25, standoff -3.4, extent -2.413,-8.029 5.987,1.171

## CONN 2POS WEIDMULLER 5.08mm [mm]
pads (2):
  rect 3x3 hole 1.5: 1(0,0)
  round 3 hole 1.5: 2(5.08,0)
Top Overlay:
  circle w0.4: c0,2.7 r0.2
Top Assembly:
  lines w0.1: -3.6,-10 8.557,-10 8.557,2 -3.6,2 -3.6,-10
Top Courtyard:
  lines w0.1: 2,-3.5 3,-3.5 ; 2.5,-4 2.5,-3 ; -3.8,-10.2 8.8,-10.2 8.8,3.2 -3.8,3.2 -3.8,-10.2
Top Designator:
  text ".Designator" at -0.205,-3.772 h1.2
3D body "1241060000.stp": height 9.4, standoff -3.2, extent -3.6,-10 8.56,2

## CONN/ETHERNET/HR911130A [mm]
pads (18):
  rect 1.524x1.524 hole 0.91: 1(5.72,-8.89)
  round 1.524 hole 0.91: 2(4.44,-6.35) 3(3.18,-8.89) 4(1.9,-6.35) 5(0.64,-8.89) 6(-0.64,-6.35) 7(-1.9,-8.89) 8(-3.18,-6.35) 9(-4.44,-8.89) 10(-5.72,-6.35)
  round 1.7 hole 1.1: 11(6.625,4.9) 12(4.085,4.9) 13(-4.085,4.9) 14(-6.625,4.9)
  round 2.159 hole 1.651: S(-7.745,-3.05) S(7.745,-3.05)
  round 3.25 hole 3.25 unplated: ""(-5.715,0) ""(5.715,0)
Top Overlay:
  circle w0.3: c8.4,-8.9 r0.1
  lines w0.1: -7.999,-5.501 -7.999,-10.5 -3,-10.5 ; 3.001,-10.5 8,-10.5 8,-5.501
Top Assembly:
  lines w0.1: -7.087,10.9 -7.087,9.3 -4.987,9.3 -4.987,10.9 ; 4.988,10.9 4.988,9.3 7.088,9.3 7.088,10.9 ; -7.999,-10.5 -7.999,10.9 8,10.9 8,-10.5 -7.999,-10.5
Top Courtyard:
  lines w0.05: -9.465,-10.998 9.535,-10.998 9.535,11.102 -9.465,11.102 -9.465,-10.998
  lines w0.1: -0.5,0 0.5,0 ; 0,-0.5 0,0.5
Top Designator:
  text ".Designator" at -2.67,-0.22 h1.2
3D body "User Library-HR911130A.STEP": height 13.5, standoff -3, extent -7.94,-10.5 7.94,10.9